# Altium footprint library standard.PcbLib: 330 footprints (part 20 of 21)
Each footprint in its own frame and in the unit in brackets; x right, y up, seen from the top. Pads: shape width x height; smd on the part's side, far side on the other; paste and mask are expansions set on the pad; w line width, h text height; cw(c..) or ccw(c..) is an arc to the next point about the centre after c.
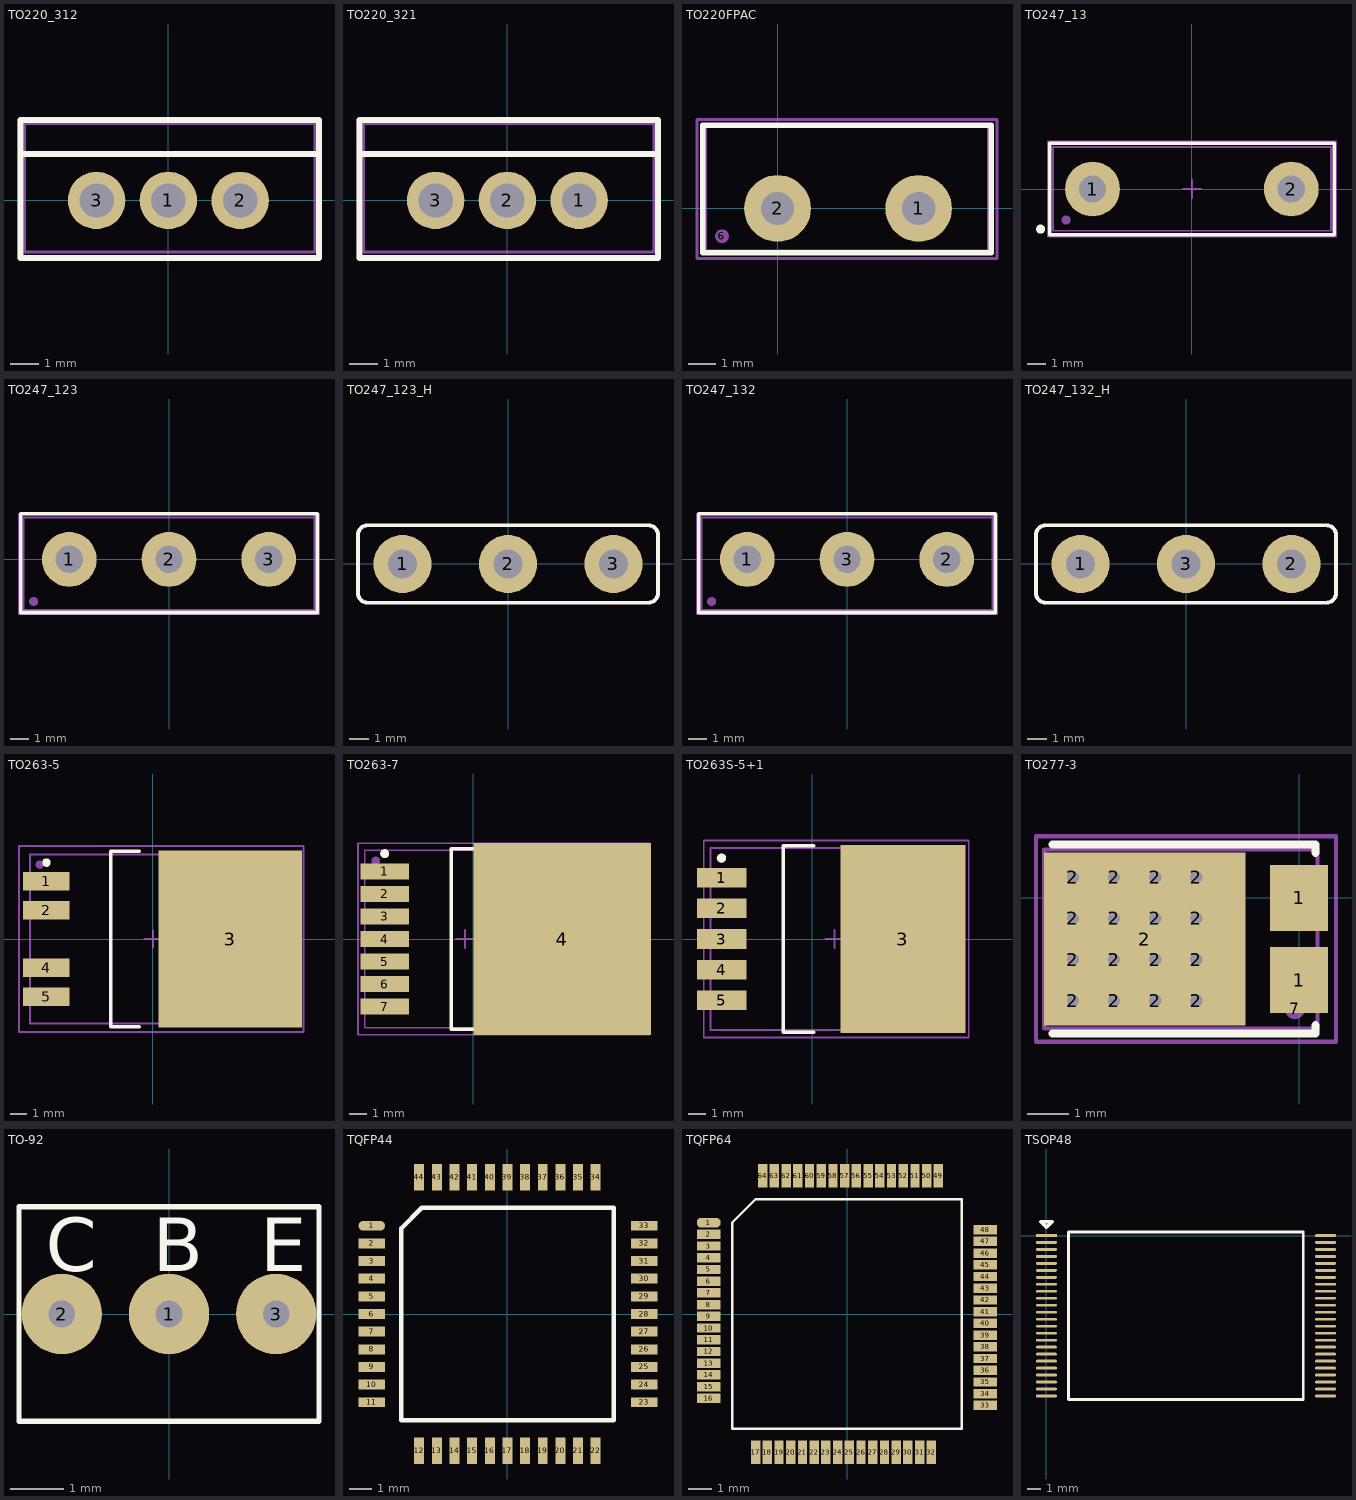
[diagram p19: the footprints below, top view; thin cyan lines are the x and y axes]

## TO220_312 [mm] "Generic TO-220 case, stay variant"
height 22
pads (3):
  round 2 hole 1.2: 1(0,0) 2(2.5,0) 3(-2.5,0)
Top Overlay:
  lines w0.2: -5.15,1.619 5.247,1.619 ; -5.15,-2 -5.15,2.8 5.247,2.8 5.247,-2 -5.15,-2
Mechanical 1:
  lines w0.1: -5,1.6 5.1,1.6 ; -5,-1.8 5.1,-1.8 5.1,2.675 -5,2.675 -5,-1.8
Mechanical 15:
  lines w0.1: -0.5,0 0.5,0 ; 0,-0.5 0,0.5 ; -5.2,-2 -5.2,2.8 5.247,2.8 5.247,-2 -5.2,-2
3D body "User Library-TO-220-4.STEP": height 22.06, standoff -6.74, extent -5,-1.8 5.2,2.7

## TO220_321 [mm] "Generic TO-220 case, stay variant"
height 22
pads (3):
  round 2 hole 1.2: 1(2.5,0) 2(0,0) 3(-2.5,0)
Top Overlay:
  lines w0.2: -5.15,1.619 5.247,1.619 ; -5.15,-2 -5.15,2.8 5.247,2.8 5.247,-2 -5.15,-2
Mechanical 1:
  lines w0.1: -5,1.6 5.1,1.6 ; -5,-1.8 5.1,-1.8 5.1,2.675 -5,2.675 -5,-1.8
Mechanical 15:
  lines w0.1: -0.5,0 0.5,0 ; 0,-0.5 0,0.5 ; -5.2,-2 -5.2,2.8 5.247,2.8 5.247,-2 -5.2,-2
3D body "User Library-TO-220-4.STEP": height 22.06, standoff -6.74, extent -5,-1.8 5.2,2.7

## TO220FPAC [mm]
pads (3):
  round 2.4 hole 1.2: 1(5.08,0) 2(0,0)
  round 0.5 on Mech1: 6(-2,-1)
Top Overlay:
  lines w0.2: -2.7,-1.6 7.7,-1.6 7.7,3 -2.7,3 -2.7,-1.6
Mechanical 1:
  lines w0.1: -2.59,-1.533 7.59,-1.533 7.59,2.977 -2.59,2.977 -2.59,-1.533
Mechanical 15:
  lines w0.1: -2.9,-1.8 -2.9,3.2 7.9,3.2 7.9,-1.8 -2.9,-1.8
3D body "TO-220FPAC.stp": height 21.15, standoff -8.45, extent -2.59,-1.533 7.59,2.977

## TO247_13 [mm] "3-Lead Plastic TO-247"
height 20
pads (4):
  round 3 hole 1.5: 1(-5.45,0) 2(5.45,0)
  round 0.5 on Top Overlay: ""(-8.3,-2.2)
  round 0.5 on Mech1: ""(-6.9,-1.7)
Top Overlay:
  lines w0.2: -7.8,-2.5 -7.8,2.5 7.8,2.5 7.8,-2.5 -7.8,-2.5
Mechanical 1:
  lines w0.1: -7.62,-2.286 -7.62,2.311 7.62,2.311 7.62,-2.286 -7.62,-2.286
Mechanical 15:
  lines w0.1: -0.5,0 0.5,0 ; 0,-0.5 0,0.5 ; -7.9,-2.6 7.9,-2.6 7.9,2.6 -7.9,2.6 -7.9,-2.6
3D body "User Library-TO-247-2_PIN.STEP": height 24.33, standoff -11.73, extent -7.62,-2.286 7.62,2.311

## TO247_123 [mm] "3-Lead Plastic TO-247"
height 20
pads (4):
  round 3 hole 1.5: 1(-5.45,0) 2(0,0) 3(5.45,0)
  round 0.5 on Mech1: ""(-7.4,-2.3)
Top Overlay:
  lines w0.2: -8.1,-2.9 -8.1,2.5 8.1,2.5 8.1,-2.9 -8.1,-2.9
Mechanical 1:
  lines w0.1: -7.95,2.3 -7.95,2.3 ; -7.95,2.3 -7.95,-2.75 7.95,-2.75 7.95,2.35 7.9,2.3 -7.95,2.3
Mechanical 15:
  lines w0.1: -0.5,0 0.5,0 ; 0,-0.5 0,0.5 ; -8.2,-3 8.2,-3 8.2,2.5 -8.2,2.5 -8.2,-3
3D body "TO247_3_21.STEP": height 26.95, standoff -2.47, extent -7.95,-2.75 7.95,2.35

## TO247_123_H [mm] "3-Lead Plastic TO-247"
height 20
pads (3):
  round 3 hole 1.5: 1(-5.45,0) 2(0,0) 3(5.45,0)
Top Overlay:
  lines w0.2: -7.75,-1.5 ccw(c-7.25,-1.5) -7.25,-2 7.25,-2 ccw(c7.25,-1.5) 7.75,-1.5 7.75,1.5 ccw(c7.25,1.5) 7.25,2 -7.25,2 ccw(c-7.25,1.5) -7.75,1.5 -7.75,-1.5
Mechanical 1:
  lines w0.1: -7.75,-1.5 ccw(c-7.25,-1.5) -7.25,-2 7.25,-2 ccw(c7.25,-1.5) 7.75,-1.5 7.75,1.5 ccw(c7.25,1.5) 7.25,2 -7.25,2 ccw(c-7.25,1.5) -7.75,1.5 -7.75,-1.5
Mechanical 15:
  lines w0.1: -0.5,0 0.5,0 ; 0,-0.5 0,0.5 ; -7.75,-1.5 ccw(c-7.25,-1.5) -7.25,-2 7.25,-2 ccw(c7.25,-1.5) 7.75,-1.5 7.75,1.5 ccw(c7.25,1.5) 7.25,2 -7.25,2 ccw(c-7.25,1.5) -7.75,1.5 -7.75,-1.5
3D body "User Library-TO-247H.STEP": height 3.9, standoff -8, extent -7.75,-0.3 7.75,28.1

## TO247_132 [mm] "3-Lead Plastic TO-247"
height 20
pads (4):
  round 3 hole 1.5: 1(-5.45,0) 2(5.45,0) 3(0,0)
  round 0.5 on Mech1: ""(-7.4,-2.3)
Top Overlay:
  lines w0.2: -8.1,-2.9 8.1,-2.9 8.1,2.5 -8.1,2.5 -8.1,-2.9
Mechanical 1:
  lines w0.1: -7.95,2.3 7.9,2.3 7.95,2.35 7.95,-2.75 -7.95,-2.75 -7.95,2.3 ; -7.95,2.3 -7.95,2.3
Mechanical 15:
  lines w0.1: -0.5,0 0.5,0 ; 0,-0.5 0,0.5 ; -8.2,-3 -8.2,2.5 8.2,2.5 8.2,-3 -8.2,-3
3D body "TO247_3_21.STEP": height 26.95, standoff -2.47, extent -7.95,-2.75 7.95,2.35

## TO247_132_H [mm] "3-Lead Plastic TO-247"
height 20
pads (3):
  round 3 hole 1.5: 1(-5.45,0) 2(5.45,0) 3(0,0)
Top Overlay:
  lines w0.2: -7.75,-1.5 ccw(c-7.25,-1.5) -7.25,-2 7.25,-2 ccw(c7.25,-1.5) 7.75,-1.5 7.75,1.5 ccw(c7.25,1.5) 7.25,2 -7.25,2 ccw(c-7.25,1.5) -7.75,1.5 -7.75,-1.5
Mechanical 1:
  lines w0.1: -7.75,-1.5 ccw(c-7.25,-1.5) -7.25,-2 7.25,-2 ccw(c7.25,-1.5) 7.75,-1.5 7.75,1.5 ccw(c7.25,1.5) 7.25,2 -7.25,2 ccw(c-7.25,1.5) -7.75,1.5 -7.75,-1.5
Mechanical 15:
  lines w0.1: -0.5,0 0.5,0 ; 0,-0.5 0,0.5 ; -7.75,-1.5 ccw(c-7.25,-1.5) -7.25,-2 7.25,-2 ccw(c7.25,-1.5) 7.75,-1.5 7.75,1.5 ccw(c7.25,1.5) 7.25,2 -7.25,2 ccw(c-7.25,1.5) -7.75,1.5 -7.75,-1.5
3D body "User Library-TO-247H.STEP": height 3.9, standoff -8, extent -7.75,-0.3 7.75,28.1

## TO263-5 [mm]
height 4.65
pads (6):
  rect 2.75x1.1 smd: 1(-6.3,3.42) 2(-6.3,1.71) 4(-6.3,-1.71) 5(-6.3,-3.42)
  rect 8.5x10.5 smd: 3(4.572,0)
  round 0.5 on Mech1: ""(-6.7,4.4)
Top Overlay:
  circle w0.25: c-6.3,4.52 r0.125
  lines w0.2: -0.8,-5.2 -2.5,-5.2 -2.5,5.2 -0.8,5.2
Mechanical 1:
  lines w0.1: -7.276,-5 -7.276,5 8.394,5 8.394,-5 -7.276,-5
Mechanical 15:
  lines w0.1: -0.5,0 0.5,0 ; 0,-0.5 0,0.5 ; -7.925,-5.5 8.9,-5.5 8.9,5.5 -7.925,5.5 -7.925,-5.5
3D body "TO263-5S.STEP": height 4.93, standoff 0.13, extent -7.276,-5 8.394,5

## TO263-7 [mm] "TO263-7 (D2Pak, 7-Pads)"
height 4.6
pads (9):
  rect 2.75x0.89 smd paste+0: 1(-5,3.81) 4(-5,0)
  rect 2.75x0.89 smd: 2(-5,2.54) 3(-5,1.27) 5(-5,-1.27) 6(-5,-2.54) 7(-5,-3.81)
  rect 10x10.8 smd: 4(5,0)
  round 0.5 on Mech1: ""(-5.5,4.4)
Top Overlay:
  circle w0.25: c-5,4.81 r0.125
  lines w0.2: 0.923,-5.08 -1.25,-5.08 -1.25,5.08 0.93,5.08
Mechanical 1:
  lines w0.1: -6.117,-5 -6.117,5 9.553,5 9.553,-5 -6.117,-5
Mechanical 15:
  lines w0.1: -0.974,0 0.026,0 ; -0.472,-0.5 -0.472,0.5 ; -6.502,-5.4 -6.498,5.4 9.9,5.4 9.9,-5.4 -6.502,-5.4
3D body "TO263-7-1.STEP": height 4.83, standoff 0.03, extent -6.117,-5 9.553,5

## TO263S-5+1 [mm]
height 4.65
pads (7):
  rect 2.75x1.1 smd: 1(-5.062,3.42) 2(-5.062,1.71) 3(-5.062,0) 4(-5.062,-1.71) 5(-5.062,-3.42)
  rect 7x10.5 smd: 3(5.063,0)
  round 0.5 on Mech1: ""(-5.1,4.5)
Top Overlay:
  circle w0.25: c-5.062,4.52 r0.125
  lines w0.2: 0.088,-5.2 -1.612,-5.2 -1.612,5.2 0.088,5.2
Mechanical 1:
  lines w0.1: -5.69,-5.08 8.325,-5.08 8.325,5.08 -5.69,5.08 -5.69,-5.08
Mechanical 15:
  lines w0.1: 0.738,0 1.738,0 ; 1.238,-0.5 1.238,0.5 ; -6.062,-5.5 -6.062,5.5 8.738,5.5 8.738,-5.5 -6.062,-5.5
3D body "TO263-5+1.STEP": height 4.56, standoff 0, extent -5.69,-5.08 8.325,5.08

## TO277-3 [mm]
pads (20):
  rect 1.4x1.6 smd: 1(0,-2) 1(0,0)
  round 0.7 hole 0.3: 2(-5.5,-2.5) 2(-5.5,-1.5) 2(-5.5,-0.5) 2(-5.5,0.5) 2(-4.5,-2.5) 2(-4.5,-1.5) 2(-4.5,-0.5) 2(-4.5,0.5) 2(-3.5,-2.5) 2(-3.5,-1.5) 2(-3.5,-0.5) 2(-3.5,0.5) 2(-2.5,-2.5) 2(-2.5,-1.5) 2(-2.5,-0.5) 2(-2.5,0.5)
  rect 4.9x4.2 smd: 2(-3.75,-1)
  round 0.5 on Mech1: 7(-0.1,-2.7)
Top Overlay:
  lines w0.2: -6,-3.3 0.4,-3.3 0.4,-3.1 ; -6,1.3 0.4,1.3 0.4,1.1
Mechanical 1:
  lines w0.1: -6.2,1.175 0.45,1.175 0.45,-3.175 -6.2,-3.175 -6.2,1.175 ; -6.2,1.175 -6.2,1.175
Mechanical 15:
  lines w0.1: -6.4,-3.5 0.9,-3.5 0.9,1.5 -6.4,1.5 -6.4,-3.5
3D body "TO-277_3L.stp": height 1.25, standoff 0, extent -6.2,-3.175 0.45,1.175

## TO-92 [mm]
pads (3):
  round 1.5 hole 0.5: 1(0,0) 2(-2,0) 3(2,0)
Top Overlay:
  lines w0.1: -2.8,-2 -2.8,2 2.8,2 2.8,-2 -2.8,-2
  text "E" at 1.7,0.8 h1
  text "B" at -0.3,0.8 h1
  text "C" at -2.3,0.8 h1

## TQFP44 [mm]
height 1.2
pads (44):
  oval 1.2x0.45 smd: 1(-6.15,4)
  rect 1.2x0.45 smd: 2(-6.15,3.2) 3(-6.15,2.4) 4(-6.15,1.6) 5(-6.15,0.8) 6(-6.15,0) 7(-6.15,-0.8) 8(-6.15,-1.6) 9(-6.15,-2.4) 10(-6.15,-3.2) 11(-6.15,-4) 23(6.2,-4) 24(6.2,-3.2) 25(6.2,-2.4) 26(6.2,-1.6) 27(6.2,-0.8) 28(6.2,0) 29(6.2,0.8) 30(6.2,1.6) 31(6.2,2.4) 32(6.2,3.2) 33(6.2,4)
  rect 0.45x1.2 smd: 12(-4,-6.2) 13(-3.2,-6.2) 14(-2.4,-6.2) 15(-1.6,-6.2) 16(-0.8,-6.2) 17(0,-6.2) 18(0.8,-6.2) 19(1.6,-6.2) 20(2.4,-6.2) 21(3.2,-6.2) 22(4,-6.2) 34(4,6.2) 35(3.2,6.2) 36(2.4,6.2) 37(1.6,6.2) 38(0.8,6.2) 39(0,6.2) 40(-0.8,6.2) 41(-1.6,6.2) 42(-2.4,6.2) 43(-3.2,6.2) 44(-4,6.2)
Top Overlay:
  lines w0.2: -4.815,-4.815 -4.815,3.88 -3.88,4.815 4.815,4.815 4.815,-4.815 -4.815,-4.815
3D body "TQFP44.stp": height 1.2, standoff 0, extent -6,-6 6,6

## TQFP64 [mm]
pads (64):
  oct 1x0.4 smd: 1(-5.9,3.9)
  rect 1x0.4 smd: 2(-5.9,3.4) 3(-5.9,2.9) 4(-5.9,2.4) 5(-5.9,1.9) 6(-5.9,1.4) 7(-5.9,0.9) 8(-5.9,0.4) 9(-5.9,-0.1) 10(-5.9,-0.6) 11(-5.9,-1.1) 12(-5.9,-1.6) 13(-5.9,-2.1) 14(-5.9,-2.6) 15(-5.9,-3.1) 16(-5.9,-3.6) 33(5.9,-3.9) 34(5.9,-3.4) 35(5.9,-2.9) 36(5.9,-2.4) 37(5.9,-1.9) 38(5.9,-1.4) 39(5.9,-0.9) 40(5.9,-0.4) 41(5.9,0.1) 42(5.9,0.6) 43(5.9,1.1) 44(5.9,1.6) 45(5.9,2.1) 46(5.9,2.6) 47(5.9,3.1) 48(5.9,3.6)
  rect 0.4x1 smd: 17(-3.9,-5.9) 18(-3.4,-5.9) 19(-2.9,-5.9) 20(-2.4,-5.9) 21(-1.9,-5.9) 22(-1.4,-5.9) 23(-0.9,-5.9) 24(-0.4,-5.9) 25(0.1,-5.9) 26(0.6,-5.9) 27(1.1,-5.9) 28(1.6,-5.9) 29(2.1,-5.9) 30(2.6,-5.9) 31(3.1,-5.9) 32(3.6,-5.9) 49(3.9,5.9) 50(3.4,5.9) 51(2.9,5.9) 52(2.4,5.9) 53(1.9,5.9) 54(1.4,5.9) 55(0.9,5.9) 56(0.4,5.9) 57(-0.1,5.9) 58(-0.6,5.9) 59(-1.1,5.9) 60(-1.6,5.9) 61(-2.1,5.9) 62(-2.6,5.9) 63(-3.1,5.9) 64(-3.6,5.9)
Top Overlay:
  lines w0.1: -4.9,3.9 -3.9,4.9 ; -4.9,3.9 -3.9,4.9 ; -4.9,3.9 -4.9,-4.9 4.9,-4.9 4.9,4.9 -3.9,4.9

## TSOP48 [mm]
pads (48):
  rect 1.5x0.2 smd: 1(0,0)
  oval 1.5x0.2 smd: 2(0,-0.5) 3(0,-1) 4(0,-1.5) 5(0,-2) 6(0,-2.5) 7(0,-3) 8(0,-3.5) 9(0,-4) 10(0,-4.5) 11(0,-5) 12(0,-5.5) 13(0,-6) 14(0,-6.5) 15(0,-7) 16(0,-7.5) 17(0,-8) 18(0,-8.5) 19(0,-9) 20(0,-9.5) 21(0,-10) 22(0,-10.5) 23(0,-11) 24(0,-11.5) 25(20,-11.5) 26(20,-11) 27(20,-10.5) 28(20,-10) 29(20,-9.5) 30(20,-9) 31(20,-8.5) 32(20,-8) 33(20,-7.5) 34(20,-7) 35(20,-6.5) 36(20,-6) 37(20,-5.5) 38(20,-5) 39(20,-4.5) 40(20,-4) 41(20,-3.5) 42(20,-3) 43(20,-2.5) 44(20,-2) 45(20,-1.5) 46(20,-1) 47(20,-0.5) 48(20,0)
Top Overlay:
  lines w0.2: 1.585,-11.75 1.585,0.25 9.625,0.25 18.4,0.25 18.4,-11.75 1.585,-11.75
  lines w0.254: -0.4,1 0.4,1 0,0.6 -0.4,1